# Altium footprint library Components.PcbLib: 260 footprints (part 17 of 17)
Each footprint in its own frame and in the unit in brackets; x right, y up, seen from the top. Pads: shape width x height; smd on the part's side, far side on the other; paste and mask are expansions set on the pad; w line width, h text height; cw(c..) or ccw(c..) is an arc to the next point about the centre after c.
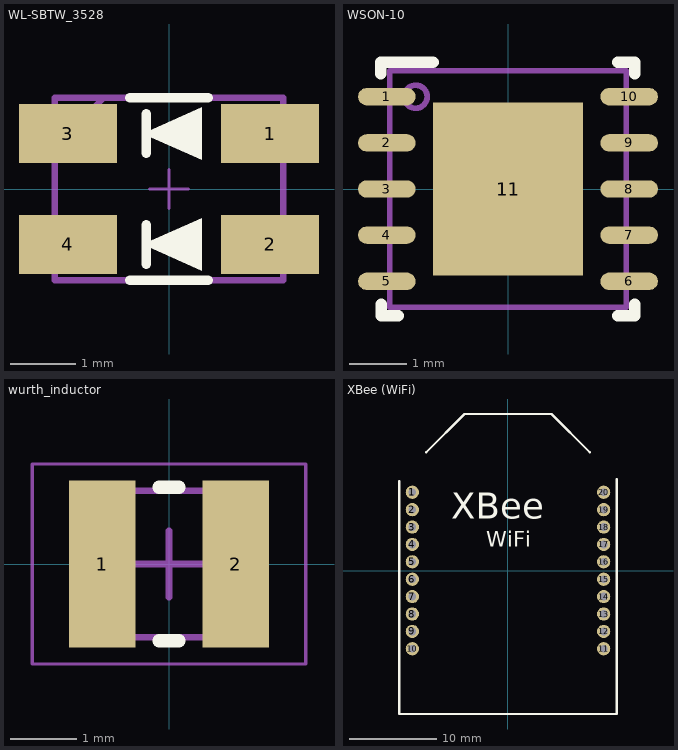
[diagram p16: the footprints below, top view; thin cyan lines are the x and y axes]

## WL-SBTW_3528 [mm] "SMD Bi-color TOP LED, body 3.2x2.8mm"
height 1.9
pads (4):
  rect 1.5x0.9 smd: 1(1.55,0.85) 2(1.55,-0.85) 3(-1.55,0.85) 4(-1.55,-0.85)
Top Overlay:
  region: -0.4,0.85 0.5,0.45 0.5,1.25
  region: -0.4,-0.85 0.5,-0.45 0.5,-1.25
  lines w0.15: -0.6,-1.4 0.6,-1.4 ; -0.6,1.4 0.6,1.4 ; -0.35,-1.15 -0.35,-0.55 ; -0.35,0.55 -0.35,1.15
Mechanical 13:
  lines w0.1: -1.75,0.65 -1,1.4 ; -1.75,-1.4 -1.75,1.4 1.75,1.4 1.75,-1.4 -1.75,-1.4
Mechanical 15:
  lines w0.05: -0.3,0 0.3,0 ; 0,-0.3 0,0.3
3D body "STEP-WL-SBTW-3528-rev1.stp": height 1.9, standoff 0, extent -1.75,-1.4 1.75,1.4

## WSON-10 [mm]
pads (11):
  oval 1x0.3 smd paste-0.102 mask+0.051: 1(-2.1,1.6) 2(-2.1,0.8) 3(-2.1,0) 4(-2.1,-0.8) 5(-2.1,-1.6) 6(2.1,-1.6) 7(2.1,-0.8) 8(2.1,0) 9(2.1,0.8) 10(2.1,1.6)
  rect 2.6x3 smd paste-1.3 mask+0.051: 11(0,0)
Top Overlay:
  lines w0.2: -2.205,2 -2.205,2.2 -1.3,2.2 ; -2.2,-2 -2.2,-2.2 -1.9,-2.2 ; 1.9,-2.2 2.2,-2.2 2.2,-2 ; 1.9,2.2 2.2,2.2 2.2,2
Top Paste:
  region: 0.1,1.41 0.1,0.1 1.248,0.1 1.248,1.41
  region: -0.1,0.1 -0.1,1.41 -1.248,1.41 -1.248,0.1
  region: -0.1,-1.41 -0.1,-0.1 -1.248,-0.1 -1.248,-1.41
  region: 0.1,-0.1 0.1,-1.41 1.248,-1.41 1.248,-0.1
Mechanical 13:
  circle w0.1: c-1.6,1.6 r0.2
  lines w0.1: -2.05,-2.05 -2.05,2.05 2.05,2.05 2.05,-2.05 -2.05,-2.05
3D body "DPR0010A.stp": height 0.8, standoff 0, extent -2,-2 2,2

## wurth_inductor [mm]
height 1
pads (2):
  rect 1x2.5 smd: 1(-1,0) 2(1,0)
Top Overlay:
  lines w0.2: -0.15,-1.15 0.15,-1.15 ; -0.15,1.15 0.15,1.15
Mechanical 13:
  lines w0.1: -1.35,-1.1 -1.35,1.1 1.35,1.1 1.35,-1.1 -1.35,-1.1
Mechanical 15:
  lines w0.05: -2.05,-1.5 -2.05,1.5 2.05,1.5 2.05,-1.5 -2.05,-1.5
  lines w0.1: -0.5,0 0.5,0 ; 0,-0.5 0,0.5
3D body: height 1, standoff 0, extent -0.75,-1.1 0.75,1.1
3D body: height 1, standoff 0, extent -1.35,-1.1 -0.75,1.1
3D body: height 1, standoff 0, extent 0.75,-1.1 1.35,1.1

## XBee (WiFi) [mil]
pads (20):
  round 60 hole 35: 1(-433.07,354.33) 2(-433.07,275.59) 3(-433.07,196.85) 4(-433.07,118.11) 5(-433.07,39.37) 6(-433.07,-39.37) 7(-433.07,-118.11) 8(-433.07,-196.85) 9(-433.07,-275.59) 10(-433.07,-354.33) 11(433.07,-354.33) 12(433.07,-275.59) 13(433.07,-196.85) 14(433.07,-118.11) 15(433.07,-39.37) 16(433.07,39.37) 17(433.07,118.11) 18(433.07,196.85) 19(433.07,275.59) 20(433.07,354.33)
Top Overlay:
  lines w10: -492.13,405.51 -492.13,-649.61 492.13,-649.61 492.13,413.39 ; -370.08,535.43 -196.85,708.66 196.85,708.66 370.08,535.43
  text "XBee" at -255.91,196.85 h200
  text "WiFi" at -97.48,83.46 h120
3D body "XBEE.STEP": height 299.21, standoff 0, extent -482.28,-649.61 482.28,649.61